# Altium footprint library PcbLib1.PcbLib: 56 footprints (part 2 of 4)
Each footprint in its own frame and in the unit in brackets; x right, y up, seen from the top. Pads: shape width x height; smd on the part's side, far side on the other; paste and mask are expansions set on the pad; w line width, h text height; cw(c..) or ccw(c..) is an arc to the next point about the centre after c.
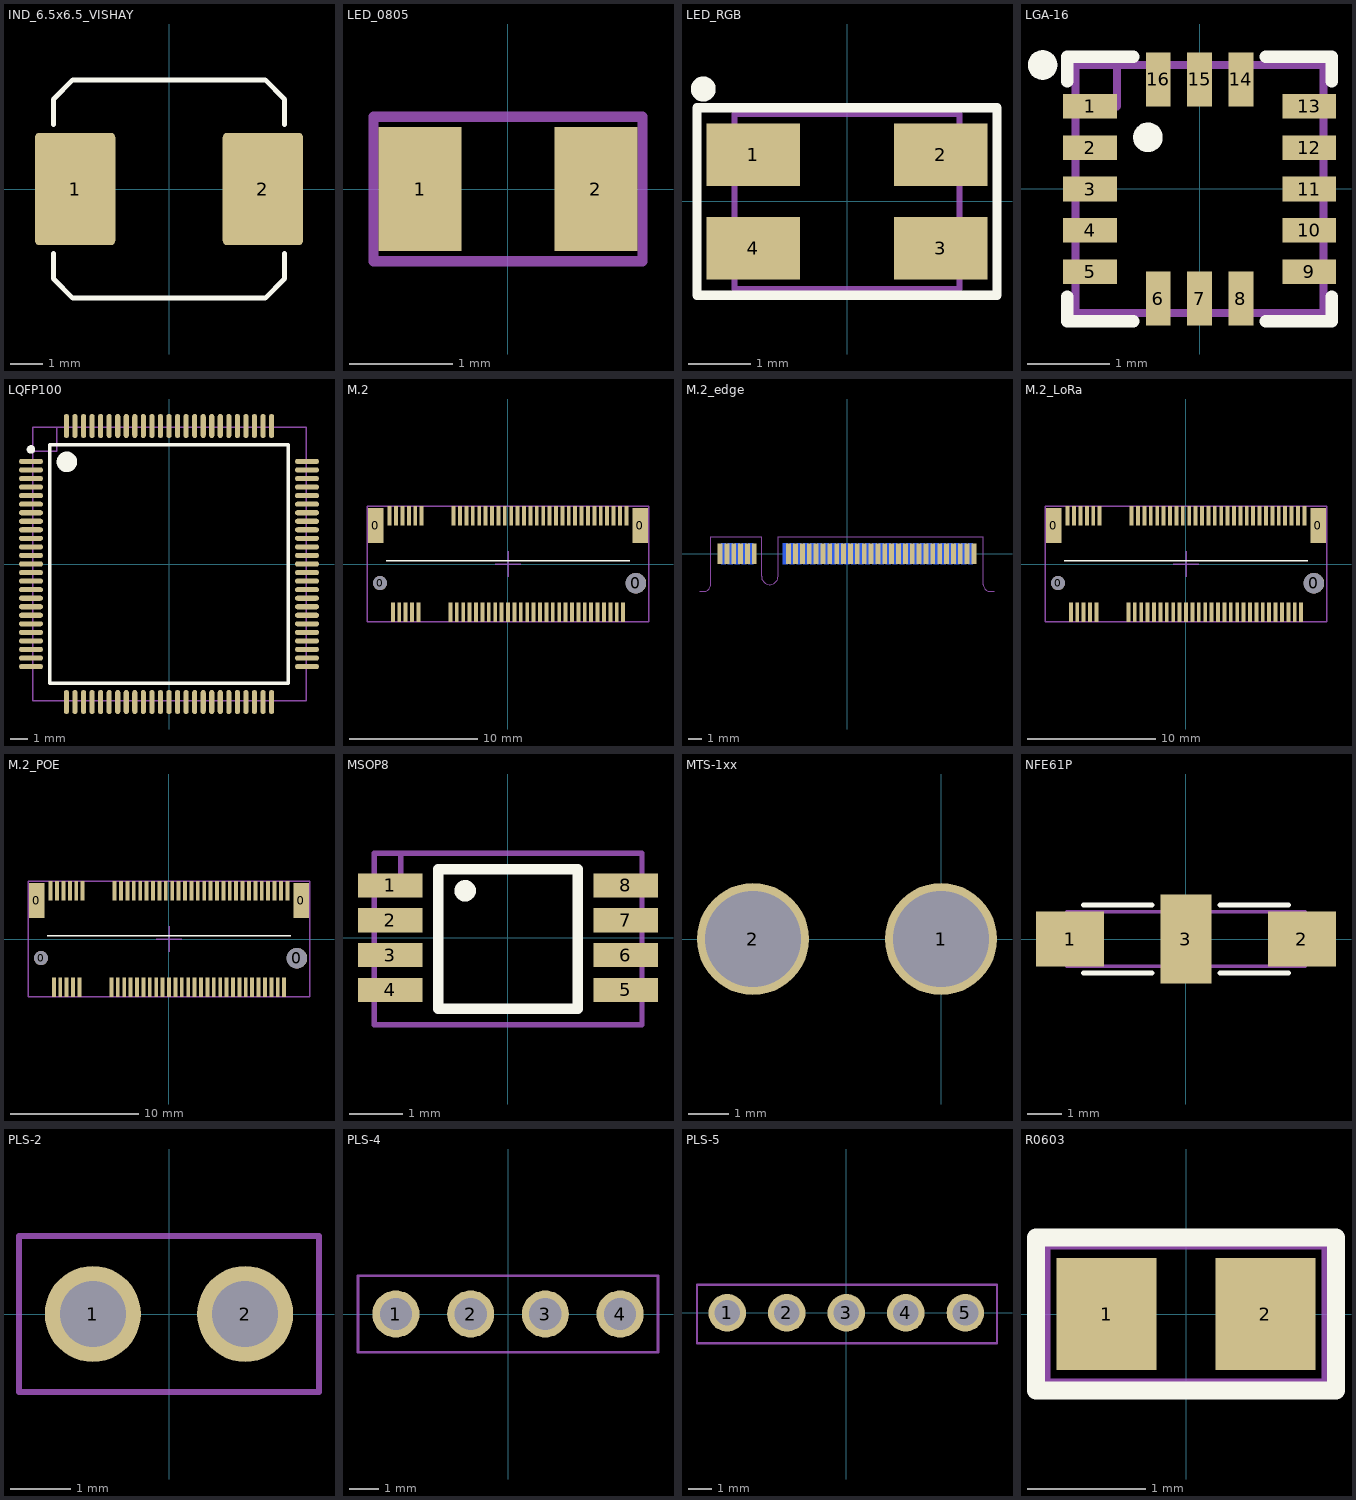
[diagram p1: the footprints below, top view; thin cyan lines are the x and y axes]

## IND_6.5x6.5_VISHAY [mm]
height 3
pads (2):
  rrect10% 2.5x3.5 smd mask+0.07: 1(-2.925,0) 2(2.925,0)
Top Overlay:
  lines w0.15: -3.6,-2 -3.6,-2.8 -3,-3.4 3,-3.4 3.6,-2.8 3.6,-2 ; -3.6,2 -3.6,2.8 -3,3.4 3,3.4 3.6,2.8 3.6,2
3D body "ihlp2525czer1r0m11.stp": height 2.89, standoff 0, extent -3.538,-3.37 3.538,3.3

## LED_0805 [mm]
pads (2):
  rect 0.8x1.2 smd: 1(-0.85,0) 2(0.85,0)
Mechanical 15:
  lines w0.1: -1.3,-0.7 1.3,-0.7 1.3,0.7 -1.3,0.7 -1.3,-0.7
  text ".Designator" at -1.4,-0.1 h0.5
3D body "LED-0805.step": height 0.9, standoff -0.01, extent -1.05,-0.675 1.05,0.675

## LED_RGB [mm]
pads (4):
  rect 1.5x1 smd: 1(-1.5,0.75) 2(1.5,0.75) 3(1.5,-0.75) 4(-1.5,-0.75)
Top Overlay:
  circle w0.2: c-2.3,1.8 r0.1
  lines w0.15: -2.4,-1.5 2.4,-1.5 2.4,1.5 -2.4,1.5 -2.4,-1.5
Mechanical 15:
  lines w0.1: -1.8,-1.4 1.8,-1.4 1.8,1.4 -1.8,1.4 -1.8,-1.4
  text ".Designator" at -1.6,0 h0.5
3D body "LED_RGB.step": height 1.9, standoff 0, extent -1.75,-1.4 1.75,1.4

## LGA-16 [mm]
pads (16):
  rect 0.65x0.3 smd mask+0.05: 1(-1.325,1) 2(-1.325,0.5) 3(-1.325,0) 4(-1.325,-0.5) 5(-1.325,-1) 9(1.325,-1) 10(1.325,-0.5) 11(1.325,0) 12(1.325,0.5) 13(1.325,1)
  rect 0.3x0.65 smd mask+0.05: 6(-0.5,-1.325) 7(0,-1.325) 8(0.5,-1.325) 14(0.5,1.325) 15(0,1.325) 16(-0.5,1.325)
Top Overlay:
  circle w0.2: c-1.9,1.5 r0.079
  circle w0.2: c-0.625,0.625 r0.079
  lines w0.15: -1.6,-1.3 -1.6,-1.6 -0.8,-1.6 ; -1.6,1.3 -1.6,1.6 -0.8,1.6 ; 0.8,-1.6 1.6,-1.6 1.6,-1.3 ; 0.8,1.6 1.6,1.6 1.6,1.3
Mechanical 15:
  lines w0.1: -1.5,1 -1,1 -1,1.5 ; -1.5,-1.5 1.5,-1.5 1.5,1.5 -1.5,1.5 -1.5,-1.5
  text ".Designator" at -1.7,-0.1 h0.5
3D body "LGA-16.step": height 1.01, standoff -0.01, extent -1.5,-1.5 1.5,1.5

## LQFP100 [mm]
pads (100):
  oval 1.4x0.3 smd: 1(-8.075,6) 2(-8.075,5.5) 3(-8.075,5) 4(-8.075,4.5) 5(-8.075,4) 6(-8.075,3.5) 7(-8.075,3) 8(-8.075,2.5) 9(-8.075,2) 10(-8.075,1.5) 11(-8.075,1) 12(-8.075,0.5) 13(-8.075,0) 14(-8.075,-0.5) 15(-8.075,-1) 16(-8.075,-1.5) 17(-8.075,-2) 18(-8.075,-2.5) 19(-8.075,-3) 20(-8.075,-3.5) 21(-8.075,-4) 22(-8.075,-4.5) 23(-8.075,-5) 24(-8.075,-5.5) 25(-8.075,-6) 51(8.075,-6) 52(8.075,-5.5) 53(8.075,-5) 54(8.075,-4.5) 55(8.075,-4) 56(8.075,-3.5) 57(8.075,-3) 58(8.075,-2.5) 59(8.075,-2) 60(8.075,-1.5) 61(8.075,-1) 62(8.075,-0.5) 63(8.075,0) 64(8.075,0.5) 65(8.075,1) 66(8.075,1.5) 67(8.075,2) 68(8.075,2.5) 69(8.075,3) 70(8.075,3.5) 71(8.075,4) 72(8.075,4.5) 73(8.075,5) 74(8.075,5.5) 75(8.075,6)
  oval 0.3x1.4 smd: 26(-6,-8.075) 27(-5.5,-8.075) 28(-5,-8.075) 29(-4.5,-8.075) 30(-4,-8.075) 31(-3.5,-8.075) 32(-3,-8.075) 33(-2.5,-8.075) 34(-2,-8.075) 35(-1.5,-8.075) 36(-1,-8.075) 37(-0.5,-8.075) 38(0,-8.075) 39(0.5,-8.075) 40(1,-8.075) 41(1.5,-8.075) 42(2,-8.075) 43(2.5,-8.075) 44(3,-8.075) 45(3.5,-8.075) 46(4,-8.075) 47(4.5,-8.075) 48(5,-8.075) 49(5.5,-8.075) 50(6,-8.075) 76(6,8.075) 77(5.5,8.075) 78(5,8.075) 79(4.5,8.075) 80(4,8.075) 81(3.5,8.075) 82(3,8.075) 83(2.5,8.075) 84(2,8.075) 85(1.5,8.075) 86(1,8.075) 87(0.5,8.075) 88(0,8.075) 89(-0.5,8.075) 90(-1,8.075) 91(-1.5,8.075) 92(-2,8.075) 93(-2.5,8.075) 94(-3,8.075) 95(-3.5,8.075) 96(-4,8.075) 97(-4.5,8.075) 98(-5,8.075) 99(-5.5,8.075) 100(-6,8.075)
Top Overlay:
  circle w0.6: c-5.975,5.975 r0.3
  circle w0.25: c-8.075,6.7 r0.125
  lines w0.2: -6.975,-6.975 6.975,-6.975 6.975,6.975 -6.975,6.975 -6.975,-6.975
Mechanical 13:
  lines w0.1: -7,-7 7,-7 7,7 -7,7 -7,-7
Mechanical 15:
  lines w0.1: -7.975,6.6 -6.575,6.6 -6.575,8 ; -7.975,-8 8.025,-8 8.025,8 -7.975,8 -7.975,-8
  text ".Designator" at -2.775,-0.5 h0.5
3D body "LQFP100_05.step": height 1.6, standoff 0, extent -8,-8 8,8

## M.2 [mm]
pads (71):
  rect 1.2x2.75 smd: 0(-10.35,3) 0(10.35,3)
  round 1.1 hole 1.1 unplated: 0(-10,-1.5)
  round 1.6 hole 1.6 unplated: 0(10,-1.5)
  rect 0.3x1.55 smd: 1(-9.25,3.775) 2(-8.75,3.775) 3(-8.25,3.775) 4(-7.75,3.775) 5(-7.25,3.775) 6(-6.75,3.775) 7(-4.25,3.775) 8(-3.75,3.775) 9(-3.25,3.775) 10(-2.75,3.775) 11(-2.25,3.775) 12(-1.75,3.775) 13(-1.25,3.775) 14(-0.75,3.775) 15(-0.25,3.775) 16(0.25,3.775) 17(0.75,3.775) 18(1.25,3.775) 19(1.75,3.775) 20(2.25,3.775) 21(2.75,3.775) 22(3.25,3.775) 23(3.75,3.775) 24(4.25,3.775) 25(4.75,3.775) 26(5.25,3.775) 27(5.75,3.775) 28(6.25,3.775) 29(6.75,3.775) 30(7.25,3.775) 31(7.75,3.775) 32(8.25,3.775) 33(8.75,3.775) 34(9.25,3.775) 35(9,-3.775) 36(8.5,-3.775) 37(8,-3.775) 38(7.5,-3.775) 39(7,-3.775) 40(6.5,-3.775) 41(6,-3.775) 42(5.5,-3.775) 43(5,-3.775) 44(4.5,-3.775) 45(4,-3.775) 46(3.5,-3.775) 47(3,-3.775) 48(2.5,-3.775) 49(2,-3.775) 50(1.5,-3.775) 51(1,-3.775) 52(0.5,-3.775) 53(0,-3.775) 54(-0.5,-3.775) 55(-1,-3.775) 56(-1.5,-3.775) 57(-2,-3.775) 58(-2.5,-3.775) 59(-3,-3.775) 60(-3.5,-3.775) 61(-4,-3.775) 62(-4.5,-3.775) 63(-7,-3.775) 64(-7.5,-3.775) 65(-8,-3.775) 66(-8.5,-3.775) 67(-9,-3.775)
Top Overlay:
  lines w0.1: -9.5,0.25 9.5,0.25
Mechanical 15:
  lines w0.1: -1,0 0,0 ; 0,-1 0,0 ; 0,1 0,0 ; 1,0 0,0 ; -11,-4.5 -11,4.5 11,4.5 11,-4.5 -11,-4.5
  text ".Designator" at -7,0.4 h0.5
3D body "M_2.stp": height 4.09, standoff -0.62, extent -10.95,-4.3 10.95,4.4

## M.2_edge [mm]
pads (67):
  rect 0.35x1.5 smd: 1(-9.25,0) 2(-8.75,0) 3(-8.25,0) 4(-7.75,0) 5(-7.25,0) 6(-6.75,0) 7(-4.25,0) 8(-3.75,0) 9(-3.25,0) 10(-2.75,0) 11(-2.25,0) 12(-1.75,0) 13(-1.25,0) 14(-0.75,0) 15(-0.25,0) 16(0.25,0) 17(0.75,0) 18(1.25,0) 19(1.75,0) 20(2.25,0) 21(2.75,0) 22(3.25,0) 23(3.75,0) 24(4.25,0) 25(4.75,0) 26(5.25,0) 27(5.75,0) 28(6.25,0) 29(6.75,0) 30(7.25,0) 31(7.75,0) 32(8.25,0) 33(8.75,0) 34(9.25,0)
  rect 0.35x1.5 smd far side: 35(9,0) 36(8.5,0) 37(8,0) 38(7.5,0) 39(7,0) 40(6.5,0) 41(6,0) 42(5.5,0) 43(5,0) 44(4.5,0) 45(4,0) 46(3.5,0) 47(3,0) 48(2.5,0) 49(2,0) 50(1.5,0) 51(1,0) 52(0.5,0) 53(0,0) 54(-0.5,0) 55(-1,0) 56(-1.5,0) 57(-2,0) 58(-2.5,0) 59(-3,0) 60(-3.5,0) 61(-4,0) 62(-4.5,0) 63(-7,0) 64(-7.5,0) 65(-8,0) 66(-8.5,0) 67(-9,0)
Top Solder:
  region: -5.025,1.25 -5.025,-1.375 9.925,-1.375 9.925,1.25
  region: -9.925,1.25 -9.925,-1.375 -6.225,-1.375 -6.225,1.25
Bottom Solder:
  region: -5.025,1.25 -5.025,-1.375 9.925,-1.375 9.925,1.25
  region: -9.925,1.25 -9.925,-1.375 -6.225,-1.375 -6.225,1.25
Mechanical 1:
  lines w0.05: -10.725,-2.75 -10.425,-2.75 ccw(c-10.425,-2.25) -9.925,-2.25 -9.925,1.25 -6.225,1.25 -6.225,-1.65 ccw(c-5.625,-1.65) -5.025,-1.65 -5.025,1.25 9.925,1.25 9.925,-2.25 ccw(c10.425,-2.25) 10.425,-2.75 10.725,-2.75

## M.2_LoRa [mm]
pads (71):
  rect 1.2x2.75 smd: 0(-10.35,3) 0(10.35,3)
  round 1.1 hole 1.1 unplated: 0(-10,-1.5)
  round 1.6 hole 1.6 unplated: 0(10,-1.5)
  rect 0.3x1.55 smd: 1(-9.25,3.775) 2(-8.75,3.775) 3(-8.25,3.775) 4(-7.75,3.775) 5(-7.25,3.775) 6(-6.75,3.775) 7(-4.25,3.775) 8(-3.75,3.775) 9(-3.25,3.775) 10(-2.75,3.775) 11(-2.25,3.775) 12(-1.75,3.775) 13(-1.25,3.775) 14(-0.75,3.775) 15(-0.25,3.775) 16(0.25,3.775) 17(0.75,3.775) 18(1.25,3.775) 19(1.75,3.775) 20(2.25,3.775) 21(2.75,3.775) 22(3.25,3.775) 23(3.75,3.775) 24(4.25,3.775) 25(4.75,3.775) 26(5.25,3.775) 27(5.75,3.775) 28(6.25,3.775) 29(6.75,3.775) 30(7.25,3.775) 31(7.75,3.775) 32(8.25,3.775) 33(8.75,3.775) 34(9.25,3.775) 35(9,-3.775) 36(8.5,-3.775) 37(8,-3.775) 38(7.5,-3.775) 39(7,-3.775) 40(6.5,-3.775) 41(6,-3.775) 42(5.5,-3.775) 43(5,-3.775) 44(4.5,-3.775) 45(4,-3.775) 46(3.5,-3.775) 47(3,-3.775) 48(2.5,-3.775) 49(2,-3.775) 50(1.5,-3.775) 51(1,-3.775) 52(0.5,-3.775) 53(0,-3.775) 54(-0.5,-3.775) 55(-1,-3.775) 56(-1.5,-3.775) 57(-2,-3.775) 58(-2.5,-3.775) 59(-3,-3.775) 60(-3.5,-3.775) 61(-4,-3.775) 62(-4.5,-3.775) 63(-7,-3.775) 64(-7.5,-3.775) 65(-8,-3.775) 66(-8.5,-3.775) 67(-9,-3.775)
Top Overlay:
  lines w0.1: -9.5,0.25 9.5,0.25
Mechanical 15:
  lines w0.1: -1,0 0,0 ; 0,-1 0,0 ; 0,1 0,0 ; 1,0 0,0 ; -11,-4.5 11,-4.5 11,4.5 -11,4.5 -11,-4.5
  text ".Designator" at -7,0.4 h0.5
3D body "M_2.stp": height 4.09, standoff -0.62, extent -10.95,-4.3 10.95,4.4
3D body "!LORA_module.step": height 13.2, standoff -0.6, extent -17.5,-49.75 13,0.75

## M.2_POE [mm]
pads (71):
  rect 1.2x2.75 smd: 0(-10.35,3) 0(10.35,3)
  round 1.1 hole 1.1 unplated: 0(-10,-1.5)
  round 1.6 hole 1.6 unplated: 0(10,-1.5)
  rect 0.3x1.55 smd: 1(-9.25,3.775) 2(-8.75,3.775) 3(-8.25,3.775) 4(-7.75,3.775) 5(-7.25,3.775) 6(-6.75,3.775) 7(-4.25,3.775) 8(-3.75,3.775) 9(-3.25,3.775) 10(-2.75,3.775) 11(-2.25,3.775) 12(-1.75,3.775) 13(-1.25,3.775) 14(-0.75,3.775) 15(-0.25,3.775) 16(0.25,3.775) 17(0.75,3.775) 18(1.25,3.775) 19(1.75,3.775) 20(2.25,3.775) 21(2.75,3.775) 22(3.25,3.775) 23(3.75,3.775) 24(4.25,3.775) 25(4.75,3.775) 26(5.25,3.775) 27(5.75,3.775) 28(6.25,3.775) 29(6.75,3.775) 30(7.25,3.775) 31(7.75,3.775) 32(8.25,3.775) 33(8.75,3.775) 34(9.25,3.775) 35(9,-3.775) 36(8.5,-3.775) 37(8,-3.775) 38(7.5,-3.775) 39(7,-3.775) 40(6.5,-3.775) 41(6,-3.775) 42(5.5,-3.775) 43(5,-3.775) 44(4.5,-3.775) 45(4,-3.775) 46(3.5,-3.775) 47(3,-3.775) 48(2.5,-3.775) 49(2,-3.775) 50(1.5,-3.775) 51(1,-3.775) 52(0.5,-3.775) 53(0,-3.775) 54(-0.5,-3.775) 55(-1,-3.775) 56(-1.5,-3.775) 57(-2,-3.775) 58(-2.5,-3.775) 59(-3,-3.775) 60(-3.5,-3.775) 61(-4,-3.775) 62(-4.5,-3.775) 63(-7,-3.775) 64(-7.5,-3.775) 65(-8,-3.775) 66(-8.5,-3.775) 67(-9,-3.775)
Top Overlay:
  lines w0.1: -9.5,0.25 9.5,0.25
Mechanical 15:
  lines w0.1: -1,0 0,0 ; 0,-1 0,0 ; 0,1 0,0 ; 1,0 0,0 ; -11,-4.5 -11,4.5 11,4.5 11,-4.5 -11,-4.5
  text ".Designator" at -7,0.4 h0.5
3D body "M_2.stp": height 4.09, standoff -0.62, extent -10.95,-4.3 10.95,4.4
3D body "!POE_module.step": height 12.07, standoff 0.28, extent -23,-49.775 13,0.725

## MSOP8 [mm]
pads (8):
  rect 1.2x0.45 smd: 1(-2.2,0.975) 2(-2.2,0.325) 3(-2.2,-0.325) 4(-2.2,-0.975) 5(2.2,-0.975) 6(2.2,-0.325) 7(2.2,0.325) 8(2.2,0.975)
Top Overlay:
  circle w0.2: c-0.8,0.875 r0.1
  lines w0.2: -1.3,-1.325 1.3,-1.325 1.3,1.275 -1.3,1.275 -1.3,-1.325
Mechanical 15:
  lines w0.1: -2.5,1.075 -2,1.075 -2,1.575 ; -2.5,-1.625 2.5,-1.625 2.5,1.575 -2.5,1.575 -2.5,-1.625
  text ".Designator" at -2.1,-0.025 h0.5
3D body "MSOP8.step": height 1.1, standoff 0, extent -2.469,-1.55 2.469,1.55

## MTS-1xx [mm]
pads (2):
  round 2.8 hole 2.4 unplated: 1(0,0) 2(-4.7,0)
3D body "MTS-1xx-C2-blue-OFF.step": height 26.03, standoff -5.5, extent -6.8,-5.999 6.6,6

## NFE61P [mm]
pads (3):
  rect 2x1.6 smd: 1(-3.4,0) 2(3.4,0)
  rect 1.5x2.6 smd: 3(0,0)
Top Overlay:
  lines w0.15: -3,-1 -1,-1 ; -3,1 -1,1 ; 1,-1 3,-1 ; 1,1 3,1
Mechanical 15:
  lines w0.1: -3.5,-0.8 3.5,-0.8 3.5,0.8 -3.5,0.8 -3.5,-0.8
  text ".Designator" at -1.7,-0.2 h0.5
3D body "NFE61P.STEP": height 1.6, standoff 0, extent -3.4,-0.8 3.4,0.8

## PLS-2 [mm]
pads (2):
  round 1.6 hole 1.1: 1(-1.27,0) 2(1.27,0)
Mechanical 15:
  lines w0.1: -2.5,-1.3 2.5,-1.3 2.5,1.3 -2.5,1.3 -2.5,-1.3
  text ".Designator" at -1.7,-0.1 h0.5
3D body "PLS2.STEP": height 8.54, standoff -3, extent -2.54,-1.27 2.54,1.27

## PLS-4 [mm]
pads (4):
  round 1.6 hole 1.1: 1(-3.81,0) 2(-1.27,0) 3(1.27,0) 4(3.81,0)
Mechanical 15:
  lines w0.1: -5.1,-1.3 -5.1,1.3 5.1,1.3 5.1,-1.3 -5.1,-1.3
  text ".Designator" at -1.7,-0.1 h0.5
3D body "PLS-4.STEP": height 9.2, standoff -3.5, extent -5.08,-1.27 5.08,1.27

## PLS-5 [mm]
pads (5):
  round 1.6 hole 1.1: 1(-5.08,0) 2(-2.54,0) 3(0,0) 4(2.54,0) 5(5.08,0)
Mechanical 15:
  lines w0.1: -6.37,-1.3 6.43,-1.3 6.43,1.2 -6.37,1.2 -6.37,-1.3
  text ".Designator" at -1.9,-0.2 h0.5
3D body "PLS-5.step": height 8.54, standoff -3, extent -6.35,-1.3 6.35,1.24

## R0603 [mm]
pads (2):
  rect 0.85x0.95 smd: 1(-0.675,0) 2(0.675,0)
Top Overlay:
  lines w0.15: -1.275,-0.65 1.275,-0.65 1.275,0.65 -0.35,0.65 -1.275,0.65 -1.275,-0.65
Mechanical 15:
  lines w0.1: -1.2,-0.6 -1.2,0.6 1.2,0.6 1.2,-0.6 -1.2,-0.6
  text ".Designator" at -0.9,-0.1 h0.3
3D body "RES0603.step": height 0.45, standoff 0, extent -0.8,-0.4 0.8,0.4